# Altium footprint library ICs And Semiconductors THD.PcbLib: 350 footprints (part 1 of 22)
Each footprint in its own frame and in the unit in brackets; x right, y up, seen from the top. Pads: shape width x height; smd on the part's side, far side on the other; paste and mask are expansions set on the pad; w line width, h text height; cw(c..) or ccw(c..) is an arc to the next point about the centre after c.
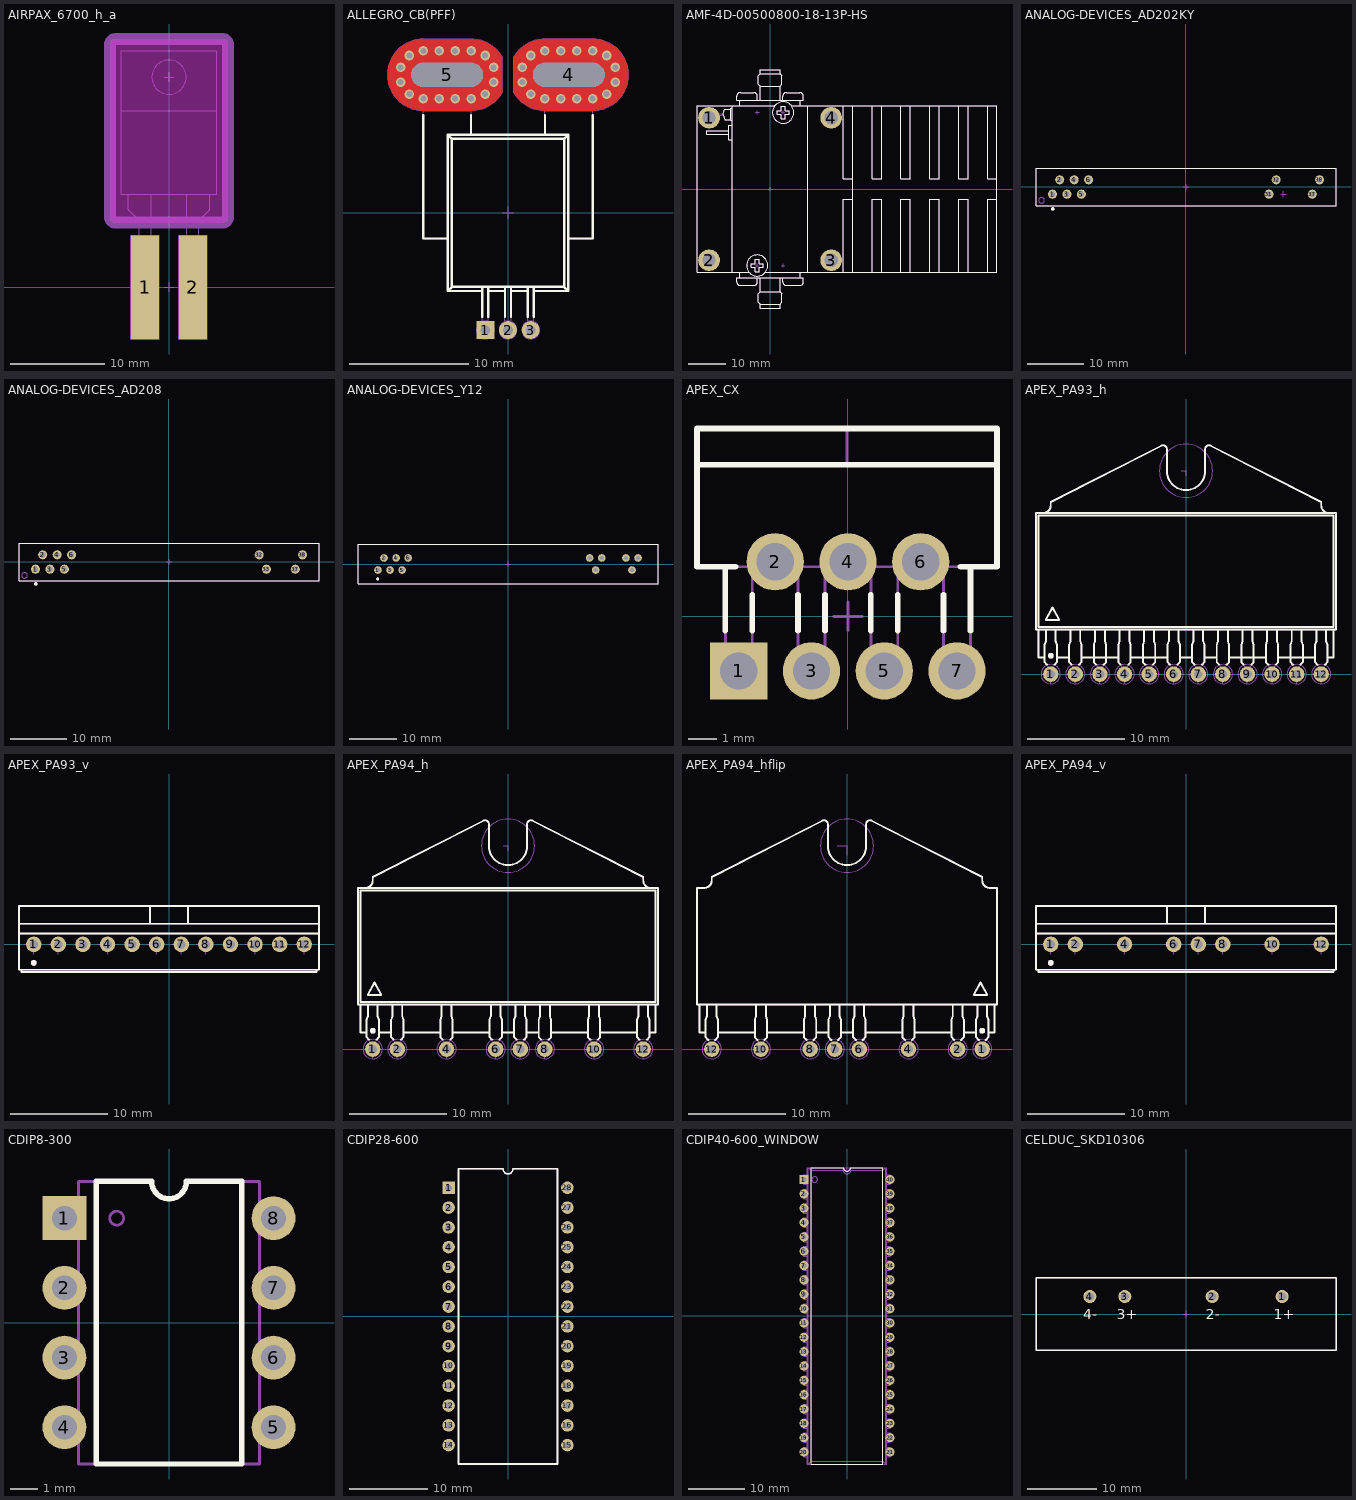
[diagram p0: the footprints below, top view; thin cyan lines are the x and y axes]

## AIRPAX_6700_h_a [mm] "TO-220 2-Terminal - Horizontal Surface Mount Through The Circuit Board"
height 4.95
pads (2):
  rect 3x11 smd paste-1.5: 1(-2.54,0) 2(2.54,0)
Keep-Out Layer:
  board cut-out: -6.25,7.45 -6.25,25.75 -6.25,25.869 -6.159,26.09 -5.99,26.259 -5.769,26.35 -5.65,26.35 5.65,26.35 5.769,26.35 5.99,26.259 6.159,26.09 6.25,25.869 6.25,25.75 6.25,7.45 6.25,7.331 6.159,7.11 5.99,6.941 5.769,6.85 5.65,6.85 -5.65,6.85 -5.769,6.85 -5.99,6.941 -6.159,7.11 -6.25,7.331
Mechanical 1:
  lines w1.27: -6.25,7.45 ccw(c-5.65,7.45) -5.65,6.85 5.65,6.85 ccw(c5.65,7.45) 6.25,7.45 6.25,25.75 ccw(c5.65,25.75) 5.65,26.35 -5.65,26.35 ccw(c-5.65,25.75) -6.25,25.75 -6.25,7.45
Notvisible:
  lines w0.1: -3.04,0 -2.54,0 ; -2.54,-0.5 -2.54,0 ; -2.54,0.5 -2.54,0 ; -2.04,0 -2.54,0 ; -0.5,0 0,0 ; -0.5,22.3 0,22.3 ; 0,-0.5 0,0 ; 0,0.5 0,0 ; 0,21.8 0,22.3 ; 0,22.8 0,22.3 ; 0.5,0 0,0 ; 0.5,22.3 0,22.3 ; 2.04,0 2.54,0 ; 2.54,-0.5 2.54,0 ; 2.54,0.5 2.54,0 ; 3.04,0 2.54,0 ; -6.25,7.45 ccw(c-5.65,7.45) -5.65,6.85 5.65,6.85 ccw(c5.65,7.45) 6.25,7.45 6.25,25.75 ccw(c5.65,25.75) 5.65,26.35 -5.65,26.35 ccw(c-5.65,25.75) -6.25,25.75 -6.25,7.45 ; -4.04,-5.5 -4.04,5.5 -1.04,5.5 -1.04,-5.5 -4.04,-5.5 ; 1.04,-5.5 1.04,5.5 4.04,5.5 4.04,-5.5 1.04,-5.5
Mechanical 14:
  circle w0.1: c0,22.3 r1.82
  lines w0.1: -5.08,25.09 5.08,25.09 ; -5.08,25.09 -5.08,9.85 5.08,9.85 5.08,25.09 ; -5.08,25.09 5.08,25.09 ; -3.175,7.105 -1.905,7.105 ; -3.175,7.105 -4.305,8.235 -4.305,9.85 -1.905,9.85 -1.905,7.105 ; -3.175,7.105 -3.175,4.36 -1.905,4.36 -1.905,7.105 ; -3.175,7.105 -1.905,7.105 ; 1.905,7.105 1.905,4.36 3.175,4.36 3.175,7.105 ; 1.905,7.105 3.175,7.105 ; 1.905,7.105 1.905,9.85 4.305,9.85 4.305,8.235 3.175,7.105 ; 1.905,7.105 3.175,7.105 ; -5.08,18.74 5.08,18.74 -5.08,18.74 ; -2.96,-4.5 -2.96,4.36 -2.12,4.36 -2.12,-4.5 -2.96,-4.5 ; 2.12,-4.5 2.12,4.36 2.96,4.36 2.96,-4.5 2.12,-4.5
Drill Drawing:
  lines w0.1: -6.25,11.2 -6.25,12.1 ; -5.65,11.382 -6.25,11.6 ; -5.65,11.818 -6.25,11.6 ; -4.4,26.35 -3.5,26.35 ; -4.218,7.45 -4,6.85 ; -4.218,25.75 -4,26.35 ; -3.782,7.45 -4,6.85 ; -3.782,25.75 -4,26.35 ; -0.5,16.6 0,16.6 ; 0,16.1 0,16.6 ; 0,17.1 0,16.6 ; 0.5,16.6 0,16.6 ; 1.77,7.777 5.323,7.777 6.074,7.026 ; 5.168,7.448 6.074,7.026 ; 5.65,11.382 6.25,11.6 ; 5.65,11.818 6.25,11.6 ; 5.652,7.932 6.074,7.026 ; -6.25,11.6 6.25,11.6 ; -4,6.85 -4,26.35 ; -6.25,7.45 ccw(c-5.65,7.45) -5.65,6.85 5.65,6.85 ccw(c5.65,7.45) 6.25,7.45 6.25,25.75 ccw(c5.65,25.75) 5.65,26.35 -5.65,26.35 ccw(c-5.65,25.75) -6.25,25.75 -6.25,7.45 ; -4.4,6.85 -3.5,6.85 -4.4,6.85 ; 6.25,11.2 6.25,12.1 6.25,11.2
  text "r0.6" at 1.863,7.892 h1
  text "19.5mm" at -4.279,14.521 h1
  text "12.5mm" at 0.842,11.835 h1
3D body "AIRPAX_6700_h_a.stp": height 2.35, standoff -2.6, extent -5.08,-4.5 5.08,25.09

## ALLEGRO_CB(PFF) [mm] "ALLGRO MICROSYSTEMS Package CB, 5-pin package, leadform PFF"
height 7.1
pads (5):
  rect 1.5x1.5 hole 0.8: 1(-1.9,-9.822)
  round 1.5 hole 0.8: 2(0,-9.822) 3(1.9,-9.822)
  rrect100% 6x2 hole 2 slot 6 at 0 deg: 4(5.1,11.578) 5(-5.1,11.578)
via -7.1,13.578 diameter 0.8 hole 0.5
via -5.77,13.578 diameter 0.8 hole 0.5
via -4.43,13.578 diameter 0.8 hole 0.5
via -3.1,13.578 diameter 0.8 hole 0.5
via -1.924,13.196 diameter 0.8 hole 0.5
via -1.198,12.196 diameter 0.8 hole 0.5
via -1.198,10.96 diameter 0.8 hole 0.5
via -1.924,9.96 diameter 0.8 hole 0.5
via -3.1,9.578 diameter 0.8 hole 0.5
via -4.43,9.578 diameter 0.8 hole 0.5
via -5.77,9.578 diameter 0.8 hole 0.5
via -7.1,9.578 diameter 0.8 hole 0.5
via -8.276,9.96 diameter 0.8 hole 0.5
via -9.002,10.96 diameter 0.8 hole 0.5
via -9.002,12.196 diameter 0.8 hole 0.5
via -8.276,13.196 diameter 0.8 hole 0.5
via 1.198,12.196 diameter 0.8 hole 0.5
via 1.924,13.196 diameter 0.8 hole 0.5
via 3.1,13.578 diameter 0.8 hole 0.5
via 4.43,13.578 diameter 0.8 hole 0.5
via 5.77,13.578 diameter 0.8 hole 0.5
via 7.1,13.578 diameter 0.8 hole 0.5
via 8.276,13.196 diameter 0.8 hole 0.5
via 9.002,12.196 diameter 0.8 hole 0.5
via 9.002,10.96 diameter 0.8 hole 0.5
via 8.276,9.96 diameter 0.8 hole 0.5
via 7.1,9.578 diameter 0.8 hole 0.5
via 5.77,9.578 diameter 0.8 hole 0.5
via 4.43,9.578 diameter 0.8 hole 0.5
via 3.1,9.578 diameter 0.8 hole 0.5
via 1.924,9.96 diameter 0.8 hole 0.5
via 1.198,10.96 diameter 0.8 hole 0.5
Top Layer:
  region: -7.1,8.578 -7.336,8.578 -7.803,8.652 -8.252,8.798 -8.672,9.012 -9.054,9.29 -9.388,9.623 -9.666,10.005 -9.88,10.426 -10.026,10.875 -10.1,11.342 -10.1,11.814 -10.026,12.28 -9.88,12.729 -9.666,13.15 -9.388,13.532 -9.054,13.866 -8.672,14.144 -8.252,14.358 -7.803,14.504 -7.336,14.578 -7.1,14.578 -3.1,14.578 -2.903,14.578 -2.513,14.526 -2.132,14.424 -1.769,14.273 -1.428,14.076 -1.116,13.836 -0.838,13.558 -0.598,13.245 -0.5,13.074 -0.5,10.081 -0.598,9.91 -0.838,9.598 -1.116,9.319 -1.428,9.079 -1.769,8.882 -2.132,8.731 -2.513,8.629 -2.903,8.578 -3.1,8.578
  region: 0.5,10.081 0.598,9.91 0.838,9.598 1.116,9.319 1.428,9.079 1.769,8.882 2.132,8.731 2.513,8.629 2.903,8.578 3.1,8.578 7.1,8.578 7.336,8.578 7.803,8.652 8.252,8.798 8.672,9.012 9.054,9.29 9.388,9.623 9.666,10.005 9.88,10.426 10.026,10.875 10.1,11.342 10.1,11.814 10.026,12.28 9.88,12.729 9.666,13.15 9.388,13.532 9.054,13.866 8.672,14.144 8.252,14.358 7.803,14.504 7.336,14.578 7.1,14.578 3.1,14.578 2.903,14.578 2.513,14.526 2.132,14.424 1.769,14.273 1.428,14.076 1.116,13.836 0.838,13.558 0.598,13.245 0.5,13.074
Bottom Layer:
  region: -7.1,8.578 -7.336,8.578 -7.803,8.652 -8.252,8.798 -8.672,9.012 -9.054,9.29 -9.388,9.623 -9.666,10.005 -9.88,10.426 -10.026,10.875 -10.1,11.342 -10.1,11.814 -10.026,12.28 -9.88,12.729 -9.666,13.15 -9.388,13.532 -9.054,13.866 -8.672,14.144 -8.252,14.358 -7.803,14.504 -7.336,14.578 -7.1,14.578 -3.1,14.578 -2.903,14.578 -2.513,14.526 -2.132,14.424 -1.769,14.273 -1.428,14.076 -1.116,13.836 -0.838,13.558 -0.598,13.245 -0.5,13.074 -0.5,10.081 -0.598,9.91 -0.838,9.598 -1.116,9.319 -1.428,9.079 -1.769,8.882 -2.132,8.731 -2.513,8.629 -2.903,8.578 -3.1,8.578
  region: 0.5,10.081 0.598,9.91 0.838,9.598 1.116,9.319 1.428,9.079 1.769,8.882 2.132,8.731 2.513,8.629 2.903,8.578 3.1,8.578 7.1,8.578 7.336,8.578 7.803,8.652 8.252,8.798 8.672,9.012 9.054,9.29 9.388,9.623 9.666,10.005 9.88,10.426 10.026,10.875 10.1,11.342 10.1,11.814 10.026,12.28 9.88,12.729 9.666,13.15 9.388,13.532 9.054,13.866 8.672,14.144 8.252,14.358 7.803,14.504 7.336,14.578 7.1,14.578 3.1,14.578 2.903,14.578 2.513,14.526 2.132,14.424 1.769,14.273 1.428,14.076 1.116,13.836 0.838,13.558 0.598,13.245 0.5,13.074
Top Overlay:
  lines w0.2: -7.1,8.178 -7.1,-2.15 -5.1,-2.15 ; -3.1,6.55 -3.1,8.178 ; -2.155,-8.701 -2.155,-6.2 ; -2.155,-6.55 -5.05,-6.55 ; -1.645,-8.701 -1.645,-6.2 ; -1.645,-6.55 -0.255,-6.55 ; -0.255,-8.701 -0.255,-6.2 ; 0.255,-8.701 0.255,-6.2 ; 0.255,-6.55 1.645,-6.55 ; 1.645,-8.701 1.645,-6.2 ; 2.155,-8.701 2.155,-6.2 ; 2.155,-6.55 5.05,-6.55 ; 3.1,6.55 3.1,8.178 ; 5.1,-2.15 7.1,-2.15 7.1,8.178 ; -5.05,-6.55 -4.7,-6.2 ; -5.05,-6.55 -5.05,6.55 ; -5.05,6.55 -4.7,6.2 ; -5.05,6.55 5.05,6.55 ; -4.7,-6.2 -4.7,6.2 ; -4.7,-6.2 4.7,-6.2 ; -4.7,6.2 4.7,6.2 ; 4.7,-6.2 4.7,6.2 ; 4.7,-6.2 5.05,-6.55 ; 4.7,6.2 5.05,6.55 ; 5.05,-6.55 5.05,6.55
Notvisible:
  drawing of 258 lines, arcs and shapes, not listed
Mechanical 14:
  lines w0.1: -5.1,-2.15 -7.1,-2.15 -7.1,12.45 -3.1,12.45 -3.1,6.55 ; -2.155,-6.55 -5.05,-6.55 ; -2.155,-6.2 -2.155,-10.319 -1.645,-10.319 -1.645,-6.2 ; -1.645,-6.55 -0.255,-6.55 ; -0.255,-6.2 -0.255,-10.319 0.255,-10.319 0.255,-6.2 ; 0.255,-6.55 1.645,-6.55 ; 1.645,-6.2 1.645,-10.319 2.155,-10.319 2.155,-6.2 ; 2.155,-6.55 5.05,-6.55 ; 3.1,6.55 3.1,12.45 7.1,12.45 7.1,-2.15 5.1,-2.15 ; -5.05,-6.55 -4.7,-6.2 ; -5.05,-6.55 -5.05,6.55 ; -5.05,6.55 -4.7,6.2 ; -5.05,6.55 5.05,6.55 ; -4.7,-6.2 -4.7,6.2 ; -4.7,-6.2 4.7,-6.2 ; -4.7,6.2 4.7,6.2 ; 4.7,-6.2 4.7,6.2 ; 4.7,-6.2 5.05,-6.55 ; 4.7,6.2 5.05,6.55 ; 5.05,-6.55 5.05,6.55
3D body "ALLEGRO_CB(PFF).stp": height 7.1, standoff -3.5, extent -7.1,-10.319 7.1,12.45

## AMF-4D-00500800-18-13P-HS [mm] "AMF Series Amplifier With HeatSink"
height 16.4
pads (4):
  round 5.75 hole 3.5: 1(-16.2,18.9) 2(-16.2,-18.9) 3(16.2,-18.9) 4(16.2,18.9)
Top Overlay:
  circle w0.2: c-3.429,-20.3 r2.795
  circle w0.2: c3.459,20.3 r2.844
  lines w0.2: -16.2,22.1 -19.4,22.1 ; -11.008,14.48 -16.8,14.48 -16.8,15.48 -11.008,15.48 ; -10.5,18.425 -12,18.425 -12.4,19.6 -12.4,20 -12,21.175 -10.5,21.175 ; -10,-22.1 -10,22.1 ; -10,13.08 -11.008,13.08 -11.008,16.88 -10,16.88 ; -10,18.2 -10.5,18.2 -10.5,21.4 -10,21.4 ; -7.939,-23.6 -8.85,-23.6 -8.85,-24.6 ccw(c-7.85,-24.6) -7.85,-25.6 -4.35,-25.6 ccw(c-4.35,-24.6) -3.35,-24.6 -3.35,-23.6 ; -7.939,23.6 -8.85,23.6 -8.85,24.6 cw(c-7.85,24.6) -7.85,25.6 -4.35,25.6 cw(c-4.35,24.6) -3.35,24.6 -3.35,23.6 ; -2.65,-23.6 -2.65,-27.29 ; -2.65,23.6 -2.65,27.29 ; -1.291,-22.1 60.2,-22.1 60.2,22.1 5.631,22.1 ; 2.65,-23.6 2.65,-27.29 ; 2.65,23.6 2.65,27.29 ; 3.35,-23.6 3.35,-24.6 ccw(c4.35,-24.6) 4.35,-25.6 7.85,-25.6 ccw(c7.85,-24.6) 8.85,-24.6 8.85,-23.6 7.939,-23.6 ; 3.35,23.6 3.35,24.6 cw(c4.35,24.6) 4.35,25.6 7.85,25.6 cw(c7.85,24.6) 8.85,24.6 8.85,23.6 7.939,23.6 -8,23.6 ; 8,-22.1 8,-23.6 -8,-23.6 -8,-22.1 -5.567,-22.1 -19.4,-22.1 -19.4,22.1 ; 8,22.1 8,23.6 -8,23.6 ; 10,-22.1 10,22.1 ; 19.4,-22.1 19.4,-2.7 21.9,-2.7 ; 19.4,22.1 19.4,2.7 21.9,2.7 ; 21.9,-22.1 21.9,-2.7 ; 21.9,22.1 21.9,2.7 ; 27.06,-22.1 27.06,-2.7 29.56,-2.7 29.56,-22.1 ; 27.06,22.1 27.06,2.7 29.56,2.7 29.56,22.1 ; 34.72,-22.1 34.72,-2.7 37.22,-2.7 37.22,-22.1 ; 34.72,22.1 34.72,2.7 37.22,2.7 37.22,22.1 ; 42.38,-22.1 42.38,-2.7 44.88,-2.7 44.88,-22.1 ; 42.38,22.1 42.38,2.7 44.88,2.7 44.88,22.1 ; 50.04,-22.1 50.04,-2.7 52.54,-2.7 52.54,-22.1 ; 50.04,22.1 50.04,2.7 52.54,2.7 52.54,22.1 ; 57.7,-22.1 57.7,-2.7 60.2,-2.7 ; 57.7,22.1 57.7,2.7 60.2,2.7 ; -19.4,22.1 1.257,22.1 -8,22.1 ; -8,22.1 -8,23.6 ; -8,22.1 -8,23.6 ; -2.65,-30.6 2.65,-30.6 ; -2.65,-30.6 -2.65,-31.6 2.65,-31.6 2.65,-30.6 ; -2.65,-30.6 -3.15,-30.1 -3.15,-27.79 -2.65,-27.29 ; -2.65,-27.29 2.65,-27.29 ; -2.65,27.29 2.65,27.29 ; -2.65,27.29 -3.15,27.79 -3.15,30.1 -2.65,30.6 ; -2.65,30.6 2.65,30.6 ; -2.65,30.6 -2.65,31.6 2.65,31.6 2.65,30.6 ; 2.65,-30.6 3.15,-30.1 3.15,-27.79 2.65,-27.29 ; 2.65,27.29 3.15,27.79 3.15,30.1 2.65,30.6 ; 21.9,-2.7 21.9,2.7 ; -5.033,-20.8 -3.929,-20.8 -3.929,-21.904 -2.929,-21.904 -2.929,-20.8 -1.825,-20.8 -1.825,-19.8 -2.929,-19.8 -2.929,-18.696 -3.929,-18.696 -3.929,-19.8 -5.033,-19.8 -5.033,-20.8 ; 1.855,19.8 2.959,19.8 2.959,18.696 3.959,18.696 3.959,19.8 5.064,19.8 5.064,20.8 3.959,20.8 3.959,21.904 2.959,21.904 2.959,20.8 1.855,20.8 1.855,19.8
Notvisible:
  lines w0.1: -16.7,-18.9 -16.2,-18.9 ; -16.7,18.9 -16.2,18.9 ; -16.2,-19.4 -16.2,-18.9 ; -16.2,-18.4 -16.2,-18.9 ; -16.2,18.4 -16.2,18.9 ; -16.2,19.4 -16.2,18.9 ; -15.7,-18.9 -16.2,-18.9 ; -15.7,18.9 -16.2,18.9 ; 15.7,-18.9 16.2,-18.9 ; 15.7,18.9 16.2,18.9 ; 16.2,-19.4 16.2,-18.9 ; 16.2,-18.4 16.2,-18.9 ; 16.2,18.4 16.2,18.9 ; 16.2,19.4 16.2,18.9 ; 16.7,-18.9 16.2,-18.9 ; 16.7,18.9 16.2,18.9 ; -3.429,-20.3 -3.429,-19.8 -3.429,-20.3 ; -3.429,-20.3 -2.929,-20.3 -3.429,-20.3 ; -3.429,-20.3 -3.429,-20.8 -3.429,-20.3 ; -3.429,-20.3 -3.929,-20.3 -3.429,-20.3 ; -3.429,20.3 -3.429,20.8 -3.429,20.3 ; -3.429,20.3 -3.929,20.3 -3.429,20.3 ; -3.429,20.3 -3.429,19.8 -3.429,20.3 ; -3.429,20.3 -2.929,20.3 -3.429,20.3 ; 0,0 0,0.5 0,0 ; 0,0 0.5,0 0,0 ; 0,0 0,-0.5 0,0 ; 0,0 -0.5,0 0,0 ; 3.429,-20.3 3.429,-19.8 3.429,-20.3 ; 3.429,-20.3 2.929,-20.3 3.429,-20.3 ; 3.429,-20.3 3.429,-20.8 3.429,-20.3 ; 3.429,-20.3 3.929,-20.3 3.429,-20.3 ; 3.429,20.3 3.429,20.8 3.429,20.3 ; 3.429,20.3 3.929,20.3 3.429,20.3 ; 3.429,20.3 3.429,19.8 3.429,20.3 ; 3.429,20.3 2.929,20.3 3.429,20.3
Mechanical 14:
  drawing of 154 lines, arcs and shapes, not listed
3D body "AMF-4D-00500800-18-13P-HS.stp": height 16.5, standoff 0, extent -19.4,-31.6 60.2,31.6

## ANALOG-DEVICES_AD202KY [mm] "SIP, 11 Pin, Pitch 2.54mm, Body 52.8mm X 6.6mm"
height 15.9
pads (10):
  round 1.6 hole 0.9: 1(-23.495,-1.27) 2(-22.225,1.27) 3(-20.955,-1.27) 4(-19.685,1.27) 5(-18.415,-1.27) 6(-17.145,1.27) 31(14.605,-1.27) 32(15.875,1.27) 37(22.225,-1.27) 38(23.495,1.27)
Top Overlay:
  circle w0.3: c-23.445,-3.855 r0.15
  lines w0.2: -26.4,-3.3 26.4,-3.3 26.4,3.3 -26.4,3.3 -26.4,-3.3
Notvisible:
  lines w0.1: -23.995,-1.27 -23.495,-1.27 ; -23.495,-1.77 -23.495,-1.27 ; -23.495,-0.77 -23.495,-1.27 ; -22.995,-1.27 -23.495,-1.27 ; -22.725,1.27 -22.225,1.27 ; -22.225,0.77 -22.225,1.27 ; -22.225,1.77 -22.225,1.27 ; -21.725,1.27 -22.225,1.27 ; -21.455,-1.27 -20.955,-1.27 ; -20.955,-1.77 -20.955,-1.27 ; -20.955,-0.77 -20.955,-1.27 ; -20.455,-1.27 -20.955,-1.27 ; -20.185,1.27 -19.685,1.27 ; -19.685,0.77 -19.685,1.27 ; -19.685,1.77 -19.685,1.27 ; -19.185,1.27 -19.685,1.27 ; -18.915,-1.27 -18.415,-1.27 ; -18.415,-1.77 -18.415,-1.27 ; -18.415,-0.77 -18.415,-1.27 ; -17.915,-1.27 -18.415,-1.27 ; -17.645,1.27 -17.145,1.27 ; -17.145,0.77 -17.145,1.27 ; -17.145,1.77 -17.145,1.27 ; -16.645,1.27 -17.145,1.27 ; -0.5,0 0,0 ; 0,-0.5 0,0 ; 0,0.5 0,0 ; 0.5,0 0,0 ; 14.105,-1.27 14.605,-1.27 ; 14.605,-1.77 14.605,-1.27 ; 14.605,-0.77 14.605,-1.27 ; 15.105,-1.27 14.605,-1.27 ; 15.375,1.27 15.875,1.27 ; 15.875,0.77 15.875,1.27 ; 15.875,1.77 15.875,1.27 ; 16.375,1.27 15.875,1.27 ; 16.645,-1.27 17.145,-1.27 ; 17.145,-1.77 17.145,-1.27 ; 17.145,-0.77 17.145,-1.27 ; 17.645,-1.27 17.145,-1.27 ; 21.725,-1.27 22.225,-1.27 ; 22.225,-1.77 22.225,-1.27 ; 22.225,-0.77 22.225,-1.27 ; 22.725,-1.27 22.225,-1.27 ; 22.995,1.27 23.495,1.27 ; 23.495,0.77 23.495,1.27 ; 23.495,1.77 23.495,1.27 ; 23.995,1.27 23.495,1.27
Mechanical 14:
  circle w0.1: c-25.425,-2.35 r0.5
  circle w0.3: c-23.445,-3.855 r0.15
  lines w0.1: -26.4,-3.3 26.4,-3.3 26.4,3.3 -26.4,3.3 -26.4,-3.3
3D body "ANALOG-DEVICES_AD202KY.stp": height 15.9, standoff -2.54, extent -26.4,-3.3 26.4,3.3

## ANALOG-DEVICES_AD208 [mm] "SIP, 11 Pin, Pitch 2.54mm, Body 52.8mm X 6.6mm"
height 15.9
pads (10):
  round 1.6 hole 0.9: 1(-23.495,-1.27) 2(-22.225,1.27) 3(-20.955,-1.27) 4(-19.685,1.27) 5(-18.415,-1.27) 6(-17.145,1.27) 32(15.875,1.27) 33(17.145,-1.27) 37(22.225,-1.27) 38(23.495,1.27)
Top Overlay:
  circle w0.3: c-23.445,-3.855 r0.15
  lines w0.2: -26.4,-3.3 26.4,-3.3 26.4,3.3 -26.4,3.3 -26.4,-3.3
Notvisible:
  lines w0.1: -23.995,-1.27 -23.495,-1.27 ; -23.495,-1.77 -23.495,-1.27 ; -23.495,-0.77 -23.495,-1.27 ; -22.995,-1.27 -23.495,-1.27 ; -22.725,1.27 -22.225,1.27 ; -22.225,0.77 -22.225,1.27 ; -22.225,1.77 -22.225,1.27 ; -21.725,1.27 -22.225,1.27 ; -21.455,-1.27 -20.955,-1.27 ; -20.955,-1.77 -20.955,-1.27 ; -20.955,-0.77 -20.955,-1.27 ; -20.455,-1.27 -20.955,-1.27 ; -20.185,1.27 -19.685,1.27 ; -19.685,0.77 -19.685,1.27 ; -19.685,1.77 -19.685,1.27 ; -19.185,1.27 -19.685,1.27 ; -18.915,-1.27 -18.415,-1.27 ; -18.415,-1.77 -18.415,-1.27 ; -18.415,-0.77 -18.415,-1.27 ; -17.915,-1.27 -18.415,-1.27 ; -17.645,1.27 -17.145,1.27 ; -17.145,0.77 -17.145,1.27 ; -17.145,1.77 -17.145,1.27 ; -16.645,1.27 -17.145,1.27 ; -0.5,0 0,0 ; 0,-0.5 0,0 ; 0,0.5 0,0 ; 0.5,0 0,0 ; 15.375,1.27 15.875,1.27 ; 15.875,0.77 15.875,1.27 ; 15.875,1.77 15.875,1.27 ; 16.375,1.27 15.875,1.27 ; 16.645,-1.27 17.145,-1.27 ; 17.145,-1.77 17.145,-1.27 ; 17.145,-0.77 17.145,-1.27 ; 17.645,-1.27 17.145,-1.27 ; 21.725,-1.27 22.225,-1.27 ; 22.225,-1.77 22.225,-1.27 ; 22.225,-0.77 22.225,-1.27 ; 22.725,-1.27 22.225,-1.27 ; 22.995,1.27 23.495,1.27 ; 23.495,0.77 23.495,1.27 ; 23.495,1.77 23.495,1.27 ; 23.995,1.27 23.495,1.27
Mechanical 14:
  circle w0.1: c-25.425,-2.35 r0.5
  circle w0.3: c-23.445,-3.855 r0.15
  lines w0.1: -26.4,-3.3 26.4,-3.3 26.4,3.3 -26.4,3.3 -26.4,-3.3
3D body "ANALOG-DEVICES_AD208.stp": height 15.9, standoff -2.54, extent -26.4,-3.3 26.4,3.3

## ANALOG-DEVICES_Y12 [mm] "Power SIP, Y12 Package Style, Pitch 2.54mm, Body 63mm X 8.3mm"
height 6.86
pads (12):
  round 1.6 hole 0.9: 1(-27.305,-1.27) 2(-26.035,1.27) 3(-24.765,-1.27) 4(-23.495,1.27) 5(-22.225,-1.27) 6(-20.955,1.27) 36(17.145,1.27) 37(18.415,-1.27) 38(19.685,1.27) 42(24.765,1.27) 43(26.035,-1.27) 44(27.305,1.27)
Top Overlay:
  circle w0.3: c-27.37,-3.155 r0.15
  lines w0.2: -31.496,-4.128 -31.496,4.128 31.496,4.128 31.496,-4.128 -31.496,-4.128
Notvisible:
  lines w0.1: -27.805,-1.27 -27.305,-1.27 ; -27.305,-1.77 -27.305,-1.27 ; -27.305,-0.77 -27.305,-1.27 ; -26.805,-1.27 -27.305,-1.27 ; -26.535,1.27 -26.035,1.27 ; -26.035,0.77 -26.035,1.27 ; -26.035,1.77 -26.035,1.27 ; -25.535,1.27 -26.035,1.27 ; -25.265,-1.27 -24.765,-1.27 ; -24.765,-1.77 -24.765,-1.27 ; -24.765,-0.77 -24.765,-1.27 ; -24.265,-1.27 -24.765,-1.27 ; -23.995,1.27 -23.495,1.27 ; -23.495,0.77 -23.495,1.27 ; -23.495,1.77 -23.495,1.27 ; -22.995,1.27 -23.495,1.27 ; -22.725,-1.27 -22.225,-1.27 ; -22.225,-1.77 -22.225,-1.27 ; -22.225,-0.77 -22.225,-1.27 ; -21.725,-1.27 -22.225,-1.27 ; -21.455,1.27 -20.955,1.27 ; -20.955,0.77 -20.955,1.27 ; -20.955,1.77 -20.955,1.27 ; -20.455,1.27 -20.955,1.27 ; -0.5,0 0,0 ; 0,-0.5 0,0 ; 0,0.5 0,0 ; 0.5,0 0,0 ; 16.645,1.27 17.145,1.27 ; 17.145,0.77 17.145,1.27 ; 17.145,1.77 17.145,1.27 ; 17.645,1.27 17.145,1.27 ; 17.915,-1.27 18.415,-1.27 ; 18.415,-1.77 18.415,-1.27 ; 18.415,-0.77 18.415,-1.27 ; 18.915,-1.27 18.415,-1.27 ; 19.185,1.27 19.685,1.27 ; 19.685,0.77 19.685,1.27 ; 19.685,1.77 19.685,1.27 ; 20.185,1.27 19.685,1.27 ; 24.265,1.27 24.765,1.27 ; 24.765,0.77 24.765,1.27 ; 24.765,1.77 24.765,1.27 ; 25.265,1.27 24.765,1.27 ; 25.535,-1.27 26.035,-1.27 ; 26.035,-1.77 26.035,-1.27 ; 26.035,-0.77 26.035,-1.27 ; 26.535,-1.27 26.035,-1.27 ; 26.805,1.27 27.305,1.27 ; 27.305,0.77 27.305,1.27 ; 27.305,1.77 27.305,1.27 ; 27.805,1.27 27.305,1.27
Mechanical 14:
  circle w0.3: c-27.37,-3.155 r0.15
  lines w0.1: -31.496,-4.128 -31.496,4.128 31.496,4.128 31.496,-4.128 -31.496,-4.128
3D body "ANALOG-DEVICES_Y12.stp": height 21.34, standoff -3.6, extent -31.446,-4.177 31.546,4.078

## APEX_CX [mm] "TO-220 7 Leads - Vertical Mount - APEX CX Outline"
height 20.52
pads (7):
  rect 2x2 hole 1.3: 1(-3.81,-1.905)
  round 2 hole 1.3: 2(-2.54,1.905) 3(-1.27,-1.905) 4(0,1.905) 5(1.27,-1.905) 6(2.54,1.905) 7(3.81,-1.905)
Top Overlay:
  lines w0.2: -5.27,5.29 5.205,5.29 ; -4.28,-0.505 -4.28,1.73 ; -3.929,1.73 -5.27,1.73 -5.27,6.56 5.205,6.56 5.205,1.73 3.929,1.73 ; -3.34,-0.505 -3.34,0.756 ; -1.74,-0.505 -1.74,0.756 ; -0.8,-0.505 -0.8,0.756 ; 0.8,-0.505 0.8,0.756 ; 1.74,-0.505 1.74,0.756 ; 3.34,-0.505 3.34,0.756 ; 4.28,-0.505 4.28,1.73
Notvisible:
  lines w0.1: -4.31,-1.905 -3.81,-1.905 ; -3.81,-2.405 -3.81,-1.905 ; -3.81,-1.405 -3.81,-1.905 ; -3.31,-1.905 -3.81,-1.905 ; -3.04,1.905 -2.54,1.905 ; -2.54,1.405 -2.54,1.905 ; -2.54,2.405 -2.54,1.905 ; -2.04,1.905 -2.54,1.905 ; -1.77,-1.905 -1.27,-1.905 ; -1.27,-2.405 -1.27,-1.905 ; -1.27,-1.405 -1.27,-1.905 ; -0.77,-1.905 -1.27,-1.905 ; -0.5,0 0,0 ; -0.5,1.905 0,1.905 ; -0.032,5.29 -0.032,5.925 -0.032,6.56 ; 0,-0.5 0,0 ; 0,0.5 0,0 ; 0,1.405 0,1.905 ; 0,2.405 0,1.905 ; 0.5,0 0,0 ; 0.5,1.905 0,1.905 ; 0.77,-1.905 1.27,-1.905 ; 1.27,-2.405 1.27,-1.905 ; 1.27,-1.405 1.27,-1.905 ; 1.77,-1.905 1.27,-1.905 ; 2.04,1.905 2.54,1.905 ; 2.54,1.405 2.54,1.905 ; 2.54,2.405 2.54,1.905 ; 3.04,1.905 2.54,1.905 ; 3.31,-1.905 3.81,-1.905 ; 3.81,-2.405 3.81,-1.905 ; 3.81,-1.405 3.81,-1.905 ; 4.31,-1.905 3.81,-1.905
Mechanical 14:
  lines w0.1: -5.27,5.29 5.205,5.29 ; -4.28,1.73 -4.28,-2.18 -3.34,-2.18 -3.34,1.73 ; -1.74,1.73 -1.74,-2.18 -0.8,-2.18 -0.8,1.73 ; 0.8,1.73 0.8,-2.18 1.74,-2.18 1.74,1.73 ; 3.34,1.73 3.34,-2.18 4.28,-2.18 4.28,1.73 ; -5.27,1.73 5.205,1.73 5.205,6.56 -5.27,6.56 -5.27,1.73
3D body "APEX_CX.stp": height 20.52, standoff -4, extent -5.27,-2.18 5.205,6.56

## APEX_PA93_h [mm] "Power SIP, EC Package Style, Pitch 2.54mm, Right Angle Formed Leads For Horizontal Mount"
height 6.86
pads (12):
  round 1.6 hole 0.9: 1(-13.97,0) 2(-11.43,0) 3(-8.89,0) 4(-6.35,0) 5(-3.81,0) 6(-1.27,0) 7(1.27,0) 8(3.81,0) 9(6.35,0) 10(8.89,0) 11(11.43,0) 12(13.97,0)
Top Overlay:
  circle w0.3: c-13.97,1.905 r0.15
  lines w0.2: -15.24,4.595 -15.24,1.725 -14.605,1.725 ; -14.732,16.66 ccw(c-14.732,17.422) -13.97,17.422 -13.97,17.777 -2.535,23.603 cw(c-2.362,23.264) -1.981,23.264 -1.981,21.003 ccw(c0,21.003) 1.981,21.003 1.981,23.264 cw(c2.362,23.264) 2.535,23.603 13.97,17.777 13.97,17.422 ccw(c14.732,17.422) 14.732,16.66 ; -14.478,4.595 -14.478,3.426 -14.605,3.02 -14.605,1.229 -14.36,0.984 ; -13.58,0.984 -13.335,1.229 -13.335,3.02 -13.462,3.426 -13.462,4.595 ; -13.335,1.725 -12.065,1.725 ; -11.938,4.595 -11.938,3.426 -12.065,3.02 -12.065,1.229 -11.82,0.984 ; -11.04,0.984 -10.795,1.229 -10.795,3.02 -10.922,3.426 -10.922,4.595 ; -10.795,1.725 -6.985,1.725 ; -9.398,4.595 -9.398,3.426 -9.525,3.02 -9.525,1.229 -9.28,0.984 ; -8.5,0.984 -8.255,1.229 -8.255,3.02 -8.382,3.426 -8.382,4.595 ; -6.858,4.595 -6.858,3.426 -6.985,3.02 -6.985,1.229 -6.74,0.984 ; -5.96,0.984 -5.715,1.229 -5.715,3.02 -5.842,3.426 -5.842,4.595 ; -5.715,1.725 -1.905,1.725 ; -4.318,4.595 -4.318,3.426 -4.445,3.02 -4.445,1.229 -4.2,0.984 ; -3.42,0.984 -3.175,1.229 -3.175,3.02 -3.302,3.426 -3.302,4.595 ; -1.778,4.595 -1.778,3.426 -1.905,3.02 -1.905,1.229 -1.66,0.984 ; -0.88,0.984 -0.635,1.229 -0.635,3.02 -0.762,3.426 -0.762,4.595 ; -0.635,1.725 0.635,1.725 ; 0.762,4.595 0.762,3.426 0.635,3.02 0.635,1.229 0.88,0.984 ; 1.66,0.984 1.905,1.229 1.905,3.02 1.778,3.426 1.778,4.595 ; 1.905,1.725 3.175,1.725 ; 3.302,4.595 3.302,3.426 3.175,3.02 3.175,1.229 3.42,0.984 ; 4.2,0.984 4.445,1.229 4.445,3.02 4.318,3.426 4.318,4.595 ; 4.445,1.725 8.255,1.725 ; 5.842,4.595 5.842,3.426 5.715,3.02 5.715,1.229 5.96,0.984 ; 6.74,0.984 6.985,1.229 6.985,3.02 6.858,3.426 6.858,4.595 ; 8.382,4.595 8.382,3.426 8.255,3.02 8.255,1.229 8.5,0.984 ; 9.28,0.984 9.525,1.229 9.525,3.02 9.398,3.426 9.398,4.595 ; 9.525,1.725 13.335,1.725 ; 10.922,4.595 10.922,3.426 10.795,3.02 10.795,1.229 11.04,0.984 ; 11.82,0.984 12.065,1.229 12.065,3.02 11.938,3.426 11.938,4.595 ; 13.462,4.595 13.462,3.426 13.335,3.02 13.335,1.229 13.58,0.984 ; 14.36,0.984 14.605,1.229 14.605,3.02 14.478,3.426 14.478,4.595 ; 14.605,1.725 15.24,1.725 15.24,4.595 ; -15.494,4.595 15.494,4.595 15.494,16.66 -15.494,16.66 -15.494,4.595 ; -15.24,4.849 15.24,4.849 15.24,16.406 -15.24,16.406 -15.24,4.849 ; -14.478,5.611 -13.785,6.881 -13.093,5.611 -14.478,5.611